# Altium footprint library Под микроконтроллеры.PcbLib: 24 footprints (part 2 of 2)
Each footprint in its own frame and in the unit in brackets; x right, y up, seen from the top. Pads: shape width x height; smd on the part's side, far side on the other; paste and mask are expansions set on the pad; w line width, h text height; cw(c..) or ccw(c..) is an arc to the next point about the centre after c.
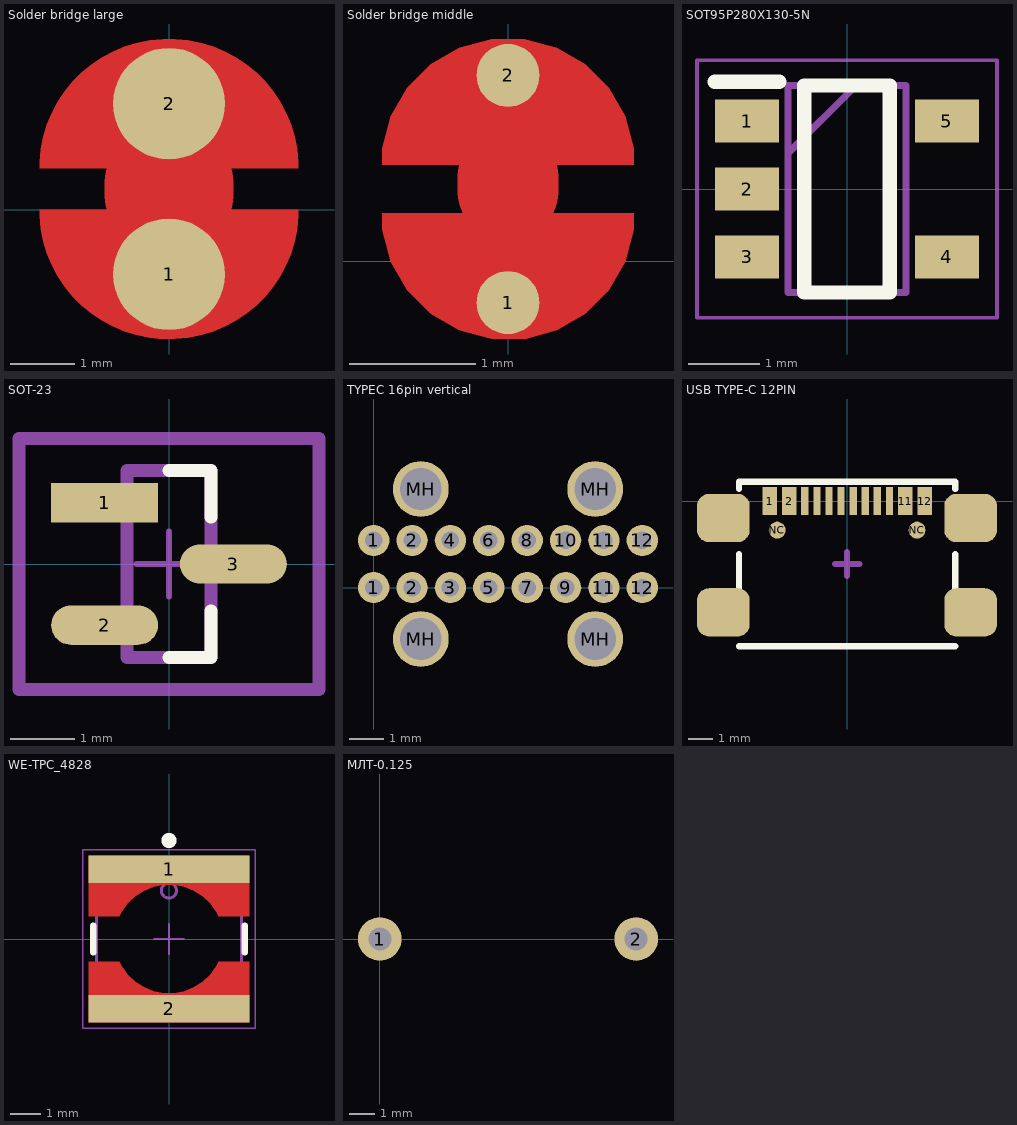
[diagram p1: the footprints below, top view; thin cyan lines are the x and y axes]

## Solder bridge large [mil]
pads (2):
  round 68 smd: 1(0,-39.37) 2(0,64.37)
Top Layer:
  region: -78.74,25 78.74,25 78.74,28.87 77.98,36.57 76.47,44.16 74.23,51.56 71.27,58.71 67.62,65.53 63.32,71.96 58.41,77.94 52.94,83.41 46.96,88.32 40.53,92.62 33.71,96.27 26.56,99.23 19.16,101.47 11.57,102.98 3.87,103.74 -3.87,103.74 -11.57,102.98 -19.16,101.47 -26.56,99.23 -33.71,96.27 -40.53,92.62 -46.96,88.32 -52.94,83.41 -58.41,77.94 -63.32,71.96 -67.62,65.53 -71.27,58.71 -74.23,51.56 -76.47,44.16 -77.98,36.57 -78.74,28.87
  region: -78.74,0 78.74,0 78.74,-3.87 77.98,-11.57 76.47,-19.16 74.23,-26.56 71.27,-33.71 67.62,-40.53 63.32,-46.96 58.41,-52.94 52.94,-58.41 46.96,-63.32 40.53,-67.62 33.71,-71.27 26.56,-74.23 19.16,-76.47 11.57,-77.98 3.87,-78.74 -3.87,-78.74 -11.57,-77.98 -19.16,-76.47 -26.56,-74.23 -33.71,-71.27 -40.53,-67.62 -46.96,-63.32 -52.94,-58.41 -58.41,-52.94 -63.32,-46.96 -67.62,-40.53 -71.27,-33.71 -74.23,-26.56 -76.47,-19.16 -77.98,-11.57 -78.74,-3.87
  lines w78.74: 0,10 0,15

## Solder bridge middle [mm]
pads (2):
  round 0.5 smd: 1(0,-0.33) 2(0,1.473)
Top Layer:
  region: -1,0.762 -1,0.894 -0.932,1.148 -0.8,1.376 -0.614,1.562 -0.386,1.694 -0.132,1.762 0.132,1.762 0.386,1.694 0.614,1.562 0.8,1.376 0.932,1.148 1,0.894 1,0.762
  region: -1,0.381 -1,0.249 -0.932,-0.005 -0.8,-0.233 -0.614,-0.419 -0.386,-0.551 -0.132,-0.619 0.132,-0.619 0.386,-0.551 0.614,-0.419 0.8,-0.233 0.932,-0.005 1,0.249 1,0.381
  lines w0.8: 0,0.559 0,0.66

## SOT95P280X130-5N [mm]
pads (5):
  rect 0.9x0.6 smd: 1(-1.4,0.95) 2(-1.4,0) 3(-1.4,-0.95) 4(1.4,-0.95) 5(1.4,0.95)
Top Overlay:
  lines w0.2: -1.85,1.5 -0.95,1.5 ; -0.6,-1.45 -0.6,1.45 0.6,1.45 0.6,-1.45 -0.6,-1.45
Top 3D Body:
  lines w0.1: -0.825,0.5 0.125,1.45 ; -0.825,-1.45 -0.825,1.45 0.825,1.45 0.825,-1.45 -0.825,-1.45
Top Courtyard:
  lines w0.05: -2.1,-1.8 -2.1,1.8 2.1,1.8 2.1,-1.8 -2.1,-1.8
3D body "XC6219B332MRN.stp": height 1.3, standoff 0, extent -1.4,-1.45 1.4,1.45

## SOT-23 [mm]
pads (3):
  rect 1.657x0.612 smd paste+0 mask+0: 1(-1.001,0.95)
  rrect100% 1.657x0.612 smd paste+0 mask+0: 2(-1.001,-0.95) 3(1.001,0)
Top Overlay:
  lines w0.2: 0,-1.45 0.65,-1.45 0.65,-0.725 ; 0,1.45 0.65,1.45 0.65,0.725
Top Assembly:
  lines w0.2: -2.329,-1.95 -2.329,1.95 2.329,1.95 2.329,-1.95 -2.329,-1.95
  text ".Designator" at 0,-0.001 h1
Top 3D Body:
  lines w0.2: -0.65,-1.45 -0.65,1.45 0.65,1.45 0.65,-1.45 -0.65,-1.45
Top Courtyard:
  lines w0.2: -2.329,-1.95 -2.329,1.95 2.329,1.95 2.329,-1.95 -2.329,-1.95
Top Component Center:
  lines w0.1: -0.5,0 0.5,0 ; 0,-0.5 0,0.5
3D body "Trans_Comchip_SS8050-G_eec.STEP": height 0.25, standoff 0, extent -2.329,-1.95 2.329,1.95

## TYPEC 16pin vertical [mm]
pads (20):
  round 0.9 hole 0.5 paste-2539.97 mask+0: 1(0,0) 1(0,1.35) 2(1.1,0) 2(1.1,1.35) 3(2.2,0) 4(2.2,1.35) 5(3.3,0) 6(3.3,1.35) 7(4.4,0) 8(4.4,1.35) 9(5.5,0) 10(5.5,1.35) 11(6.6,0) 11(6.6,1.35) 12(7.7,0) 12(7.7,1.35)
  round 1.6 hole 1.2 paste-2539.97 mask+0: MH(1.35,-1.475) MH(1.35,2.825) MH(6.35,-1.475) MH(6.35,2.825)
3D body "TYPE-C-14-vertical.step": height 6.5, standoff -1.6, extent -0.627,-1.622 8.323,2.978

## USB TYPE-C 12PIN [mm] "Chinese USB Type-C 12 pin"
height 2.56
pads (18):
  rect 0.6x1.15 smd: 1(-3.195,0) 2(-2.395,0) 11(2.405,0) 12(3.205,0)
  rect 0.3x1.15 smd: 3(-1.745,0) 4(-1.245,0) 5(-0.745,0) 6(-0.245,0) 7(0.255,0) 8(0.755,0) 9(1.255,0) 10(1.755,0)
  round 0.7 smd: NC(-2.885,-1.2) NC(2.895,-1.2)
  rrect50% 2.18x2 smd: ""(-5.11,-4.6) ""(-5.11,-0.7) ""(5.11,-4.6) ""(5.11,-0.7)
Top Overlay:
  lines w0.254: -4.465,-6 4.475,-6 ; -4.465,-3.6 -4.465,-2.2 ; -4.465,0.5 -4.465,0.8 0.005,0.8 4.475,0.8 4.475,0.5 ; 4.475,-3.6 4.475,-2.2
Top Assembly:
  lines w0.254: -0.495,-2.6 0.005,-2.6 ; 0.005,-3.1 0.005,-2.6 ; 0.005,-2.1 0.005,-2.6 ; 0.505,-2.6 0.005,-2.6
3D body "USB_Type_C_6pin v13.step": height 3.41, standoff -0.81, extent -4.465,-7.1 4.475,0.15
3D body "COM-15111--3DModel-STEP-56544.STEP": height 3.28, standoff -0.88, extent -4.47,-7.475 4.47,0.125

## WE-TPC_4828 [mm] "Power Inductor, SMD, 2-Leads, body 4.8x4.8mm"
height 2.8
pads (2):
  rect 5.3x0.9 smd paste-403.566 mask-403.566: 1(0,2.3) 2(0,-2.3)
Top Layer:
  region: -2.65,0.75 -1.636,0.75 -1.558,0.902 -1.359,1.18 -1.112,1.416 -0.824,1.6 -0.506,1.727 -0.171,1.792 0.171,1.792 0.507,1.727 0.824,1.6 1.112,1.416 1.359,1.18 1.558,0.902 1.636,0.75 2.65,0.75 2.65,2.75 -2.65,2.75
  region: 2.65,-0.75 1.636,-0.75 1.558,-0.902 1.359,-1.18 1.112,-1.416 0.824,-1.6 0.506,-1.727 0.171,-1.792 -0.171,-1.792 -0.507,-1.727 -0.824,-1.6 -1.112,-1.416 -1.359,-1.18 -1.558,-0.902 -1.636,-0.75 -2.65,-0.75 -2.65,-2.75 2.65,-2.75
Top Overlay:
  circle w0.25: c0,3.25 r0.125
  lines w0.2: -2.5,-0.45 -2.5,0.45 ; 2.5,-0.45 2.5,0.45
Top Designator:
  text ".Designator" at -7.498,-0.5 h1.5
Top Component Outline:
  circle w0.1: c0,1.6 r0.25
  lines w0.1: -2.4,-2.4 2.4,-2.4 2.4,2.4 -2.4,2.4 -2.4,-2.4
Top 3D Body:
  circle w0.1: c0,1.6 r0.25
  lines w0.1: -2.4,-2.4 2.4,-2.4 2.4,2.4 -2.4,2.4 -2.4,-2.4
Top Courtyard:
  lines w0.05: -2.85,-2.95 2.85,-2.95 2.85,2.95 -2.85,2.95 -2.85,-2.95
Top Component Center:
  lines w0.05: -0.5,0 0.5,0 ; 0,-0.5 0,0.5
3D body "744043xxx.stp": height 2.8, standoff 0, extent -2.4,-2.4 2.4,2.4

## МЛТ-0.125 [mm]
pads (2):
  round 1.7 hole 0.9: 1(0,0) 2(10,0)
3D body "RES_  _-0125.STEP": height 2.5, standoff -2, extent -0.313,-1.016 10.287,0.969